# Altium schematic symbol library jlcpcb_2025_04_capacitors_extended_0201.schlib: 1175 symbols (part 2 of 7)
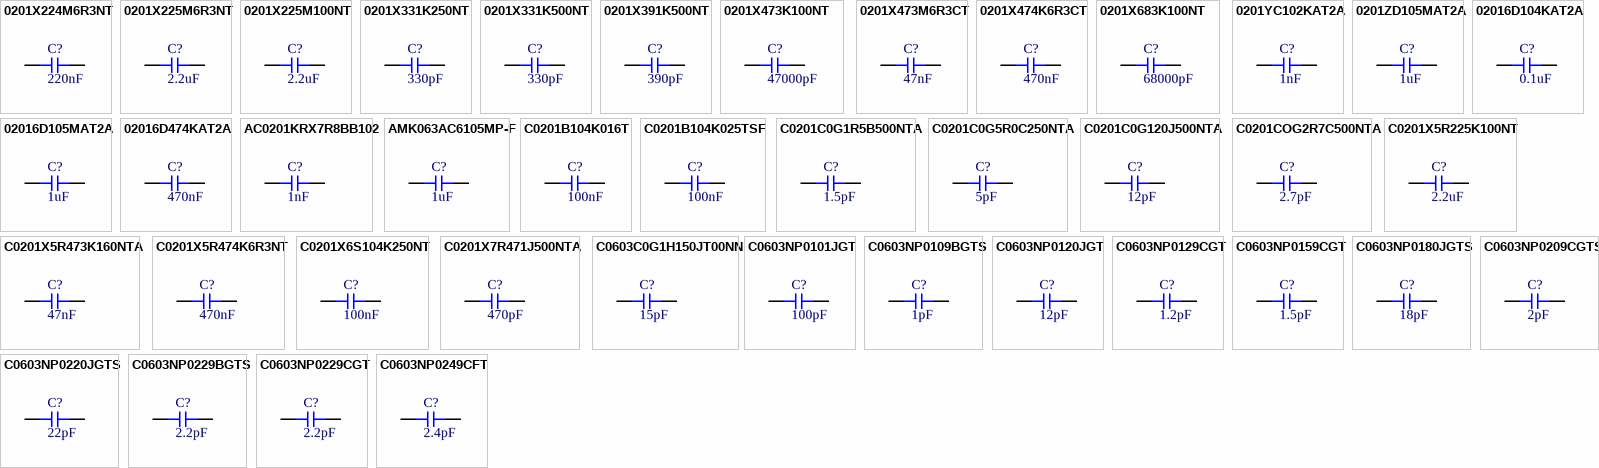
[diagram p30: symbols 0201X224M6R3NT to C0603NP0249CFT]

## C0201C0G5R0C250NTA
designator C?  Capacitance: 5pF  (hidden comment: *)
Capacitor, Ceramic (MLCC), 5pF, 25V, C0G, SMD 0201; Manufacturer: EYANG(Shenzhen Eyang Tech Development); Manufacturer Part Number: C0201C0G5R0C250NTA; Package Size: 0201; JLCPCB Basic Part: No; JLCPCB Part Number: C778329; Supplier 1: LCSC; Category: Capacitors - MLCC; Supplier Part Number 1: C778329; Voltage Rating: 25V; Temperature Coefficient: C0G; RoHS: Yes; ComponentLink1Description: Datasheet; ComponentLink1URL: https://datasheet.lcsc.com/lcsc/2011061108_EYANG-Shenzhen-Eyang-Tech-Development-C0201C0G5R0C250NTA_C778329.pdf; ComponentLink2Description: JLCPCB Part URL; ComponentLink2URL: https://jlcpcb.com/partdetail/C778329; ComponentLink3Description: LCSC Part URL; ComponentLink3URL: https://lcsc.com/product-detail/Multilayer-Ceramic-Capacitors-MLCC---SMD-SMT_EYANGShenzhen-Eyang-Tech-Development-EYANGShenzhen-Eyang-Tech-Development-C0201C0G5R0C250NTA_C778329.html
footprint CAP-0201 (0201 (0603M) Capacitor)
pins: 1, 2

## C0201C0G120J500NTA
designator C?  Capacitance: 12pF  (hidden comment: *)
Capacitor, Ceramic (MLCC), 12pF, ±5%, 50V, C0G, ±5%, SMD 0201; Manufacturer: EYANG(Shenzhen Eyang Tech Development); Manufacturer Part Number: C0201C0G120J500NTA; Package Size: 0201; JLCPCB Basic Part: No; JLCPCB Part Number: C115541; Supplier 1: LCSC; Category: Capacitors - MLCC; Supplier Part Number 1: C115541; Tolerance: ±5%; Voltage Rating: 50V; Temperature Coefficient: C0G; RoHS: Yes; ComponentLink1Description: Datasheet; ComponentLink1URL: https://datasheet.lcsc.com/lcsc/2304140030_EYANG-Shenzhen-Eyang-Tech-Development-C0201C0G120J500NTA_C115541.pdf; ComponentLink2Description: JLCPCB Part URL; ComponentLink2URL: https://jlcpcb.com/partdetail/C115541; ComponentLink3Description: LCSC Part URL; ComponentLink3URL: https://lcsc.com/product-detail/Multilayer-Ceramic-Capacitors-MLCC---SMD-SMT_EYANGShenzhen-Eyang-Tech-Development-EYANGShenzhen-Eyang-Tech-Development-C0201C0G120J500NTA_C115541.html
footprint CAP-0201 (0201 (0603M) Capacitor)
pins: 1, 2

## C0201COG2R7C500NTA
designator C?  Capacitance: 2.7pF  (hidden comment: *)
Capacitor, Ceramic (MLCC), 2.7pF, 50V, C0G, SMD 0201; Manufacturer: EYANG(Shenzhen Eyang Tech Development); Manufacturer Part Number: C0201COG2R7C500NTA; Package Size: 0201; JLCPCB Basic Part: No; JLCPCB Part Number: C183666; Supplier 1: LCSC; Category: Capacitors - MLCC; Supplier Part Number 1: C183666; Voltage Rating: 50V; Temperature Coefficient: C0G; RoHS: Yes; ComponentLink1Description: Datasheet; ComponentLink1URL: https://datasheet.lcsc.com/lcsc/2304140030_EYANG-Shenzhen-Eyang-Tech-Development-C0201COG2R7C500NTA_C183666.pdf; ComponentLink2Description: JLCPCB Part URL; ComponentLink2URL: https://jlcpcb.com/partdetail/C183666; ComponentLink3Description: LCSC Part URL; ComponentLink3URL: https://lcsc.com/product-detail/Multilayer-Ceramic-Capacitors-MLCC---SMD-SMT_EYANGShenzhen-Eyang-Tech-Development-EYANGShenzhen-Eyang-Tech-Development-C0201COG2R7C500NTA_C183666.html
footprint CAP-0201 (0201 (0603M) Capacitor)
pins: 1, 2

## C0201X5R225K100NT
designator C?  Capacitance: 2.2uF  (hidden comment: *)
Capacitor, Ceramic (MLCC), 2.2uF, ±10%, 10V, ±10%, SMD 0201; Manufacturer: SANYEAR; Manufacturer Part Number: C0201X5R225K100NT; Package Size: 0201; JLCPCB Basic Part: No; JLCPCB Part Number: C729446; Supplier 1: LCSC; Category: Capacitors - MLCC; Supplier Part Number 1: C729446; Tolerance: ±10%; Voltage Rating: 10V; RoHS: Yes; ComponentLink1Description: Datasheet; ComponentLink1URL: https://wmsc.lcsc.com/wmsc/upload/file/pdf/v2/lcsc/2304140030_SANYEAR-C0201X5R225K100NT_C729446.pdf; ComponentLink2Description: JLCPCB Part URL; ComponentLink2URL: https://jlcpcb.com/partdetail/C729446; ComponentLink3Description: LCSC Part URL; ComponentLink3URL: https://lcsc.com/product-detail/Multilayer-Ceramic-Capacitors-MLCC---SMD-SMT_SANYEAR-SANYEAR-C0201X5R225K100NT_C729446.html
footprint CAP-0201 (0201 (0603M) Capacitor)
pins: 1, 2

## C0201X5R473K160NTA
designator C?  Capacitance: 47nF  (hidden comment: *)
Capacitor, Ceramic (MLCC), 47nF, ±10%, 16V, X5R, ±10%, SMD 0201; Manufacturer: EYANG(Shenzhen Eyang Tech Development); Manufacturer Part Number: C0201X5R473K160NTA; Package Size: 0201; JLCPCB Basic Part: No; JLCPCB Part Number: C124806; Supplier 1: LCSC; Category: Capacitors - MLCC; Supplier Part Number 1: C124806; Tolerance: ±10%; Voltage Rating: 16V; Temperature Coefficient: X5R; RoHS: Yes; ComponentLink1Description: Datasheet; ComponentLink1URL: https://datasheet.lcsc.com/lcsc/2304140030_EYANG-Shenzhen-Eyang-Tech-Development-C0201X5R473K160NTA_C124806.pdf; ComponentLink2Description: JLCPCB Part URL; ComponentLink2URL: https://jlcpcb.com/partdetail/C124806; ComponentLink3Description: LCSC Part URL; ComponentLink3URL: https://lcsc.com/product-detail/Multilayer-Ceramic-Capacitors-MLCC---SMD-SMT_EYANGShenzhen-Eyang-Tech-Development-EYANGShenzhen-Eyang-Tech-Development-C0201X5R473K160NTA_C124806.html
footprint CAP-0201 (0201 (0603M) Capacitor)
pins: 1, 2

## C0201X5R474K6R3NT
designator C?  Capacitance: 470nF  (hidden comment: *)
Capacitor, Ceramic (MLCC), 470nF, ±10%, 6.3V, ±10%, SMD 0201; Manufacturer: SANYEAR; Manufacturer Part Number: C0201X5R474K6R3NT; Package Size: 0201; JLCPCB Basic Part: No; JLCPCB Part Number: C729447; Supplier 1: LCSC; Category: Capacitors - MLCC; Supplier Part Number 1: C729447; Tolerance: ±10%; Voltage Rating: 6.3V; RoHS: Yes; ComponentLink1Description: Datasheet; ComponentLink1URL: https://wmsc.lcsc.com/wmsc/upload/file/pdf/v2/lcsc/2304140030_SANYEAR-C0201X5R474K6R3NT_C729447.pdf; ComponentLink2Description: JLCPCB Part URL; ComponentLink2URL: https://jlcpcb.com/partdetail/C729447; ComponentLink3Description: LCSC Part URL; ComponentLink3URL: https://lcsc.com/product-detail/Multilayer-Ceramic-Capacitors-MLCC---SMD-SMT_SANYEAR-SANYEAR-C0201X5R474K6R3NT_C729447.html
footprint CAP-0201 (0201 (0603M) Capacitor)
pins: 1, 2

## C0201X6S104K250NT
designator C?  Capacitance: 100nF  (hidden comment: *)
Capacitor, Ceramic (MLCC), 100nF, ±10%, 25V, ±10%, SMD 0201; Manufacturer: SANYEAR; Manufacturer Part Number: C0201X6S104K250NT; Package Size: 0201; JLCPCB Basic Part: No; JLCPCB Part Number: C2844319; Supplier 1: LCSC; Category: Capacitors - MLCC; Supplier Part Number 1: C2844319; Tolerance: ±10%; Voltage Rating: 25V; RoHS: Yes; ComponentLink1Description: Datasheet; ComponentLink1URL: https://wmsc.lcsc.com/wmsc/upload/file/pdf/v2/lcsc/2304140030_SANYEAR-C0201X6S104K250NT_C2844319.pdf; ComponentLink2Description: JLCPCB Part URL; ComponentLink2URL: https://jlcpcb.com/partdetail/C2844319; ComponentLink3Description: LCSC Part URL; ComponentLink3URL: https://lcsc.com/product-detail/Multilayer-Ceramic-Capacitors-MLCC---SMD-SMT_SANYEAR-SANYEAR-C0201X6S104K250NT_C2844319.html
footprint CAP-0201 (0201 (0603M) Capacitor)
pins: 1, 2

## C0201X7R471J500NTA
designator C?  Capacitance: 470pF  (hidden comment: *)
Capacitor, Ceramic (MLCC), 470pF, ±5%, 50V, X7R, ±5%, SMD 0201; Manufacturer: EYANG(Shenzhen Eyang Tech Development); Manufacturer Part Number: C0201X7R471J500NTA; Package Size: 0201; JLCPCB Basic Part: No; JLCPCB Part Number: C881960; Supplier 1: LCSC; Category: Capacitors - MLCC; Supplier Part Number 1: C881960; Tolerance: ±5%; Voltage Rating: 50V; Temperature Coefficient: X7R; RoHS: Yes; ComponentLink1Description: Datasheet; ComponentLink1URL: https://datasheet.lcsc.com/lcsc/2011261608_EYANG-Shenzhen-Eyang-Tech-Development-C0201X7R471J500NTA_C881960.pdf; ComponentLink2Description: JLCPCB Part URL; ComponentLink2URL: https://jlcpcb.com/partdetail/C881960; ComponentLink3Description: LCSC Part URL; ComponentLink3URL: https://lcsc.com/product-detail/Multilayer-Ceramic-Capacitors-MLCC---SMD-SMT_EYANGShenzhen-Eyang-Tech-Development-EYANGShenzhen-Eyang-Tech-Development-C0201X7R471J500NTA_C881960.html
footprint CAP-0201 (0201 (0603M) Capacitor)
pins: 1, 2

## C0603C0G1H150JT00NN
designator C?  Capacitance: 15pF  (hidden comment: *)
Capacitor, Ceramic (MLCC), 15pF, ±5%, 50V, C0G, ±5%, SMD 0201; Manufacturer: TDK; Manufacturer Part Number: C0603C0G1H150JT00NN; Package Size: 0201; JLCPCB Basic Part: No; JLCPCB Part Number: C694261; Supplier 1: LCSC; Category: Capacitors - MLCC; Supplier Part Number 1: C694261; Tolerance: ±5%; Voltage Rating: 50V; Temperature Coefficient: C0G; RoHS: Yes; ComponentLink1Description: Datasheet; ComponentLink1URL: https://wmsc.lcsc.com/wmsc/upload/file/pdf/v2/lcsc/2304140030_TDK-C0603C0G1H150JT00NN_C694261.pdf; ComponentLink2Description: JLCPCB Part URL; ComponentLink2URL: https://jlcpcb.com/partdetail/C694261; ComponentLink3Description: LCSC Part URL; ComponentLink3URL: https://lcsc.com/product-detail/Multilayer-Ceramic-Capacitors-MLCC---SMD-SMT_TDK-TDK-C0603C0G1H150JT00NN_C694261.html
footprint CAP-0201 (0201 (0603M) Capacitor)
pins: 1, 2

## C0603NP0101JGT
designator C?  Capacitance: 100pF  (hidden comment: *)
Capacitor, Ceramic (MLCC), 100pF, ±5%, 50V, NP0, ±5%, SMD 0201; Manufacturer: Darfon Elec; Manufacturer Part Number: C0603NP0101JGT; Package Size: 0201; JLCPCB Basic Part: No; JLCPCB Part Number: C258474; Supplier 1: LCSC; Category: Capacitors - MLCC; Supplier Part Number 1: C258474; Tolerance: ±5%; Voltage Rating: 50V; Temperature Coefficient: NP0; RoHS: Yes; ComponentLink1Description: Datasheet; ComponentLink1URL: https://wmsc.lcsc.com/wmsc/upload/file/pdf/v2/lcsc/2304140030_Darfon-Elec-C0603NP0101JGT_C258474.pdf; ComponentLink2Description: JLCPCB Part URL; ComponentLink2URL: https://jlcpcb.com/partdetail/C258474; ComponentLink3Description: LCSC Part URL; ComponentLink3URL: https://lcsc.com/product-detail/Multilayer-Ceramic-Capacitors-MLCC---SMD-SMT_Darfon-Elec-Darfon-Elec-C0603NP0101JGT_C258474.html
footprint CAP-0201 (0201 (0603M) Capacitor)
pins: 1, 2

## C0603NP0109BGTS
designator C?  Capacitance: 1pF  (hidden comment: *)
Capacitor, Ceramic (MLCC), 1pF, 50V, NP0, SMD 0201; Manufacturer: Darfon Elec; Manufacturer Part Number: C0603NP0109BGTS; Package Size: 0201; JLCPCB Basic Part: No; JLCPCB Part Number: C312122; Supplier 1: LCSC; Category: Capacitors - MLCC; Supplier Part Number 1: C312122; Voltage Rating: 50V; Temperature Coefficient: NP0; RoHS: Yes; ComponentLink1Description: Datasheet; ComponentLink1URL: https://wmsc.lcsc.com/wmsc/upload/file/pdf/v2/lcsc/2304140030_Darfon-Elec-C0603NP0109BGTS_C312122.pdf; ComponentLink2Description: JLCPCB Part URL; ComponentLink2URL: https://jlcpcb.com/partdetail/C312122; ComponentLink3Description: LCSC Part URL; ComponentLink3URL: https://lcsc.com/product-detail/Multilayer-Ceramic-Capacitors-MLCC---SMD-SMT_Darfon-Elec-Darfon-Elec-C0603NP0109BGTS_C312122.html
footprint CAP-0201 (0201 (0603M) Capacitor)
pins: 1, 2

## C0603NP0120JGT
designator C?  Capacitance: 12pF  (hidden comment: *)
Capacitor, Ceramic (MLCC), 12pF, ±5%, 50V, NP0, ±5%, SMD 0201; Manufacturer: Darfon Elec; Manufacturer Part Number: C0603NP0120JGT; Package Size: 0201; JLCPCB Basic Part: No; JLCPCB Part Number: C258465; Supplier 1: LCSC; Category: Capacitors - MLCC; Supplier Part Number 1: C258465; Tolerance: ±5%; Voltage Rating: 50V; Temperature Coefficient: NP0; RoHS: Yes; ComponentLink1Description: Datasheet; ComponentLink1URL: https://wmsc.lcsc.com/wmsc/upload/file/pdf/v2/lcsc/2304140030_Darfon-Elec-C0603NP0120JGT_C258465.pdf; ComponentLink2Description: JLCPCB Part URL; ComponentLink2URL: https://jlcpcb.com/partdetail/C258465; ComponentLink3Description: LCSC Part URL; ComponentLink3URL: https://lcsc.com/product-detail/Multilayer-Ceramic-Capacitors-MLCC---SMD-SMT_Darfon-Elec-Darfon-Elec-C0603NP0120JGT_C258465.html
footprint CAP-0201 (0201 (0603M) Capacitor)
pins: 1, 2

## C0603NP0129CGT
designator C?  Capacitance: 1.2pF  (hidden comment: *)
Capacitor, Ceramic (MLCC), 1.2pF, 50V, NP0, SMD 0201; Manufacturer: Darfon Elec; Manufacturer Part Number: C0603NP0129CGT; Package Size: 0201; JLCPCB Basic Part: No; JLCPCB Part Number: C267348; Supplier 1: LCSC; Category: Capacitors - MLCC; Supplier Part Number 1: C267348; Voltage Rating: 50V; Temperature Coefficient: NP0; RoHS: Yes; ComponentLink1Description: Datasheet; ComponentLink1URL: https://wmsc.lcsc.com/wmsc/upload/file/pdf/v2/lcsc/2304140030_Darfon-Elec-C0603NP0129CGT_C267348.pdf; ComponentLink2Description: JLCPCB Part URL; ComponentLink2URL: https://jlcpcb.com/partdetail/C267348; ComponentLink3Description: LCSC Part URL; ComponentLink3URL: https://lcsc.com/product-detail/Multilayer-Ceramic-Capacitors-MLCC---SMD-SMT_Darfon-Elec-Darfon-Elec-C0603NP0129CGT_C267348.html
footprint CAP-0201 (0201 (0603M) Capacitor)
pins: 1, 2

## C0603NP0159CGT
designator C?  Capacitance: 1.5pF  (hidden comment: *)
Capacitor, Ceramic (MLCC), 1.5pF, 50V, NP0, SMD 0201; Manufacturer: Darfon Elec; Manufacturer Part Number: C0603NP0159CGT; Package Size: 0201; JLCPCB Basic Part: No; JLCPCB Part Number: C258458; Supplier 1: LCSC; Category: Capacitors - MLCC; Supplier Part Number 1: C258458; Voltage Rating: 50V; Temperature Coefficient: NP0; RoHS: Yes; ComponentLink1Description: Datasheet; ComponentLink1URL: https://wmsc.lcsc.com/wmsc/upload/file/pdf/v2/lcsc/2304140030_Darfon-Elec-C0603NP0159CGT_C258458.pdf; ComponentLink2Description: JLCPCB Part URL; ComponentLink2URL: https://jlcpcb.com/partdetail/C258458; ComponentLink3Description: LCSC Part URL; ComponentLink3URL: https://lcsc.com/product-detail/Multilayer-Ceramic-Capacitors-MLCC---SMD-SMT_Darfon-Elec-Darfon-Elec-C0603NP0159CGT_C258458.html
footprint CAP-0201 (0201 (0603M) Capacitor)
pins: 1, 2

## C0603NP0180JGTS
designator C?  Capacitance: 18pF  (hidden comment: *)
Capacitor, Ceramic (MLCC), 18pF, ±5%, 50V, NP0, ±5%, SMD 0201; Manufacturer: Darfon Elec; Manufacturer Part Number: C0603NP0180JGTS; Package Size: 0201; JLCPCB Basic Part: No; JLCPCB Part Number: C312097; Supplier 1: LCSC; Category: Capacitors - MLCC; Supplier Part Number 1: C312097; Tolerance: ±5%; Voltage Rating: 50V; Temperature Coefficient: NP0; RoHS: Yes; ComponentLink1Description: Datasheet; ComponentLink1URL: https://wmsc.lcsc.com/wmsc/upload/file/pdf/v2/lcsc/2304140030_Darfon-Elec-C0603NP0180JGTS_C312097.pdf; ComponentLink2Description: JLCPCB Part URL; ComponentLink2URL: https://jlcpcb.com/partdetail/C312097; ComponentLink3Description: LCSC Part URL; ComponentLink3URL: https://lcsc.com/product-detail/Multilayer-Ceramic-Capacitors-MLCC---SMD-SMT_Darfon-Elec-Darfon-Elec-C0603NP0180JGTS_C312097.html
footprint CAP-0201 (0201 (0603M) Capacitor)
pins: 1, 2

## C0603NP0209CGTS
designator C?  Capacitance: 2pF  (hidden comment: *)
Capacitor, Ceramic (MLCC), 2pF, 50V, NP0, SMD 0201; Manufacturer: Darfon Elec; Manufacturer Part Number: C0603NP0209CGTS; Package Size: 0201; JLCPCB Basic Part: No; JLCPCB Part Number: C312083; Supplier 1: LCSC; Category: Capacitors - MLCC; Supplier Part Number 1: C312083; Voltage Rating: 50V; Temperature Coefficient: NP0; RoHS: Yes; ComponentLink1Description: Datasheet; ComponentLink1URL: https://wmsc.lcsc.com/wmsc/upload/file/pdf/v2/lcsc/2304140030_Darfon-Elec-C0603NP0209CGTS_C312083.pdf; ComponentLink2Description: JLCPCB Part URL; ComponentLink2URL: https://jlcpcb.com/partdetail/C312083; ComponentLink3Description: LCSC Part URL; ComponentLink3URL: https://lcsc.com/product-detail/Multilayer-Ceramic-Capacitors-MLCC---SMD-SMT_Darfon-Elec-Darfon-Elec-C0603NP0209CGTS_C312083.html
footprint CAP-0201 (0201 (0603M) Capacitor)
pins: 1, 2

## C0603NP0220JGTS
designator C?  Capacitance: 22pF  (hidden comment: *)
Capacitor, Ceramic (MLCC), 22pF, ±5%, 50V, NP0, ±5%, SMD 0201; Manufacturer: Darfon Elec; Manufacturer Part Number: C0603NP0220JGTS; Package Size: 0201; JLCPCB Basic Part: No; JLCPCB Part Number: C258468; Supplier 1: LCSC; Category: Capacitors - MLCC; Supplier Part Number 1: C258468; Tolerance: ±5%; Voltage Rating: 50V; Temperature Coefficient: NP0; RoHS: Yes; ComponentLink1Description: Datasheet; ComponentLink1URL: https://wmsc.lcsc.com/wmsc/upload/file/pdf/v2/lcsc/2304140030_Darfon-Elec-C0603NP0220JGTS_C258468.pdf; ComponentLink2Description: JLCPCB Part URL; ComponentLink2URL: https://jlcpcb.com/partdetail/C258468; ComponentLink3Description: LCSC Part URL; ComponentLink3URL: https://lcsc.com/product-detail/Multilayer-Ceramic-Capacitors-MLCC---SMD-SMT_Darfon-Elec-Darfon-Elec-C0603NP0220JGTS_C258468.html
footprint CAP-0201 (0201 (0603M) Capacitor)
pins: 1, 2

## C0603NP0229BGTS
designator C?  Capacitance: 2.2pF  (hidden comment: *)
Capacitor, Ceramic (MLCC), 2.2pF, 50V, NP0, SMD 0201; Manufacturer: Darfon Elec; Manufacturer Part Number: C0603NP0229BGTS; Package Size: 0201; JLCPCB Basic Part: No; JLCPCB Part Number: C312076; Supplier 1: LCSC; Category: Capacitors - MLCC; Supplier Part Number 1: C312076; Voltage Rating: 50V; Temperature Coefficient: NP0; RoHS: Yes; ComponentLink1Description: Datasheet; ComponentLink1URL: https://wmsc.lcsc.com/wmsc/upload/file/pdf/v2/lcsc/2304140030_Darfon-Elec-C0603NP0229BGTS_C312076.pdf; ComponentLink2Description: JLCPCB Part URL; ComponentLink2URL: https://jlcpcb.com/partdetail/C312076; ComponentLink3Description: LCSC Part URL; ComponentLink3URL: https://lcsc.com/product-detail/Multilayer-Ceramic-Capacitors-MLCC---SMD-SMT_Darfon-Elec-Darfon-Elec-C0603NP0229BGTS_C312076.html
footprint CAP-0201 (0201 (0603M) Capacitor)
pins: 1, 2

## C0603NP0229CGT
designator C?  Capacitance: 2.2pF  (hidden comment: *)
Capacitor, Ceramic (MLCC), 2.2pF, 50V, NP0, SMD 0201; Manufacturer: Darfon Elec; Manufacturer Part Number: C0603NP0229CGT; Package Size: 0201; JLCPCB Basic Part: No; JLCPCB Part Number: C267353; Supplier 1: LCSC; Category: Capacitors - MLCC; Supplier Part Number 1: C267353; Voltage Rating: 50V; Temperature Coefficient: NP0; RoHS: Yes; ComponentLink1Description: Datasheet; ComponentLink1URL: https://wmsc.lcsc.com/wmsc/upload/file/pdf/v2/lcsc/2304140030_Darfon-Elec-C0603NP0229CGT_C267353.pdf; ComponentLink2Description: JLCPCB Part URL; ComponentLink2URL: https://jlcpcb.com/partdetail/C267353; ComponentLink3Description: LCSC Part URL; ComponentLink3URL: https://lcsc.com/product-detail/Multilayer-Ceramic-Capacitors-MLCC---SMD-SMT_Darfon-Elec-Darfon-Elec-C0603NP0229CGT_C267353.html
footprint CAP-0201 (0201 (0603M) Capacitor)
pins: 1, 2

## C0603NP0249CFT
designator C?  Capacitance: 2.4pF  (hidden comment: *)
Capacitor, Ceramic (MLCC), 2.4pF, 25V, NP0, SMD 0201; Manufacturer: Darfon Elec; Manufacturer Part Number: C0603NP0249CFT; Package Size: 0201; JLCPCB Basic Part: No; JLCPCB Part Number: C267354; Supplier 1: LCSC; Category: Capacitors - MLCC; Supplier Part Number 1: C267354; Voltage Rating: 25V; Temperature Coefficient: NP0; RoHS: Yes; ComponentLink1Description: Datasheet; ComponentLink1URL: https://wmsc.lcsc.com/wmsc/upload/file/pdf/v2/lcsc/2304140030_Darfon-Elec-C0603NP0249CFT_C267354.pdf; ComponentLink2Description: JLCPCB Part URL; ComponentLink2URL: https://jlcpcb.com/partdetail/C267354; ComponentLink3Description: LCSC Part URL; ComponentLink3URL: https://lcsc.com/product-detail/Multilayer-Ceramic-Capacitors-MLCC---SMD-SMT_Darfon-Elec-Darfon-Elec-C0603NP0249CFT_C267354.html
footprint CAP-0201 (0201 (0603M) Capacitor)
pins: 1, 2

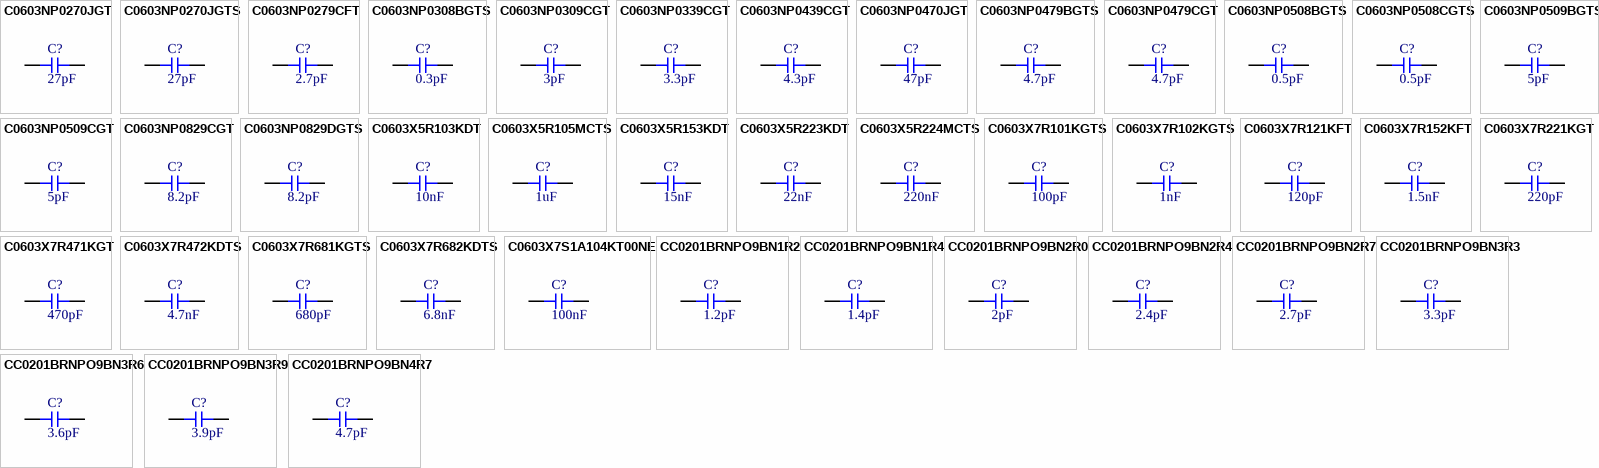
[diagram p5: symbols C0603NP0270JGT to CC0201BRNPO9BN4R7]

## C0603NP0270JGT
designator C?  Capacitance: 27pF  (hidden comment: *)
Capacitor, Ceramic (MLCC), 27pF, ±5%, 50V, NP0, ±5%, SMD 0201; Manufacturer: Darfon Elec; Manufacturer Part Number: C0603NP0270JGT; Package Size: 0201; JLCPCB Basic Part: No; JLCPCB Part Number: C258469; Supplier 1: LCSC; Category: Capacitors - MLCC; Supplier Part Number 1: C258469; Tolerance: ±5%; Voltage Rating: 50V; Temperature Coefficient: NP0; RoHS: Yes; ComponentLink1Description: Datasheet; ComponentLink1URL: https://wmsc.lcsc.com/wmsc/upload/file/pdf/v2/lcsc/2304140030_Darfon-Elec-C0603NP0270JGT_C258469.pdf; ComponentLink2Description: JLCPCB Part URL; ComponentLink2URL: https://jlcpcb.com/partdetail/C258469; ComponentLink3Description: LCSC Part URL; ComponentLink3URL: https://lcsc.com/product-detail/Multilayer-Ceramic-Capacitors-MLCC---SMD-SMT_Darfon-Elec-Darfon-Elec-C0603NP0270JGT_C258469.html
footprint CAP-0201 (0201 (0603M) Capacitor)
pins: 1, 2

## C0603NP0270JGTS
designator C?  Capacitance: 27pF  (hidden comment: *)
Capacitor, Ceramic (MLCC), 27pF, ±5%, 50V, NP0, ±5%, SMD 0201; Manufacturer: Darfon Elec; Manufacturer Part Number: C0603NP0270JGTS; Package Size: 0201; JLCPCB Basic Part: No; JLCPCB Part Number: C312072; Supplier 1: LCSC; Category: Capacitors - MLCC; Supplier Part Number 1: C312072; Tolerance: ±5%; Voltage Rating: 50V; Temperature Coefficient: NP0; RoHS: Yes; ComponentLink1Description: Datasheet; ComponentLink1URL: https://wmsc.lcsc.com/wmsc/upload/file/pdf/v2/lcsc/2304140030_Darfon-Elec-C0603NP0270JGTS_C312072.pdf; ComponentLink2Description: JLCPCB Part URL; ComponentLink2URL: https://jlcpcb.com/partdetail/C312072; ComponentLink3Description: LCSC Part URL; ComponentLink3URL: https://lcsc.com/product-detail/Multilayer-Ceramic-Capacitors-MLCC---SMD-SMT_Darfon-Elec-Darfon-Elec-C0603NP0270JGTS_C312072.html
footprint CAP-0201 (0201 (0603M) Capacitor)
pins: 1, 2

## C0603NP0279CFT
designator C?  Capacitance: 2.7pF  (hidden comment: *)
Capacitor, Ceramic (MLCC), 2.7pF, 25V, NP0, SMD 0201; Manufacturer: Darfon Elec; Manufacturer Part Number: C0603NP0279CFT; Package Size: 0201; JLCPCB Basic Part: No; JLCPCB Part Number: C267355; Supplier 1: LCSC; Category: Capacitors - MLCC; Supplier Part Number 1: C267355; Voltage Rating: 25V; Temperature Coefficient: NP0; RoHS: Yes; ComponentLink1Description: Datasheet; ComponentLink1URL: https://wmsc.lcsc.com/wmsc/upload/file/pdf/v2/lcsc/2304140030_Darfon-Elec-C0603NP0279CFT_C267355.pdf; ComponentLink2Description: JLCPCB Part URL; ComponentLink2URL: https://jlcpcb.com/partdetail/C267355; ComponentLink3Description: LCSC Part URL; ComponentLink3URL: https://lcsc.com/product-detail/Multilayer-Ceramic-Capacitors-MLCC---SMD-SMT_Darfon-Elec-Darfon-Elec-C0603NP0279CFT_C267355.html
footprint CAP-0201 (0201 (0603M) Capacitor)
pins: 1, 2

## C0603NP0308BGTS
designator C?  Capacitance: 0.3pF  (hidden comment: *)
Capacitor, Ceramic (MLCC), 0.3pF, 50V, NP0, SMD 0201; Manufacturer: Darfon Elec; Manufacturer Part Number: C0603NP0308BGTS; Package Size: 0201; JLCPCB Basic Part: No; JLCPCB Part Number: C312062; Supplier 1: LCSC; Category: Capacitors - MLCC; Supplier Part Number 1: C312062; Voltage Rating: 50V; Temperature Coefficient: NP0; RoHS: Yes; ComponentLink1Description: Datasheet; ComponentLink1URL: https://wmsc.lcsc.com/wmsc/upload/file/pdf/v2/lcsc/2304140030_Darfon-Elec-C0603NP0308BGTS_C312062.pdf; ComponentLink2Description: JLCPCB Part URL; ComponentLink2URL: https://jlcpcb.com/partdetail/C312062; ComponentLink3Description: LCSC Part URL; ComponentLink3URL: https://lcsc.com/product-detail/Multilayer-Ceramic-Capacitors-MLCC---SMD-SMT_Darfon-Elec-Darfon-Elec-C0603NP0308BGTS_C312062.html
footprint CAP-0201 (0201 (0603M) Capacitor)
pins: 1, 2

## C0603NP0309CGT
designator C?  Capacitance: 3pF  (hidden comment: *)
Capacitor, Ceramic (MLCC), 3pF, 50V, NP0, SMD 0201; Manufacturer: Darfon Elec; Manufacturer Part Number: C0603NP0309CGT; Package Size: 0201; JLCPCB Basic Part: No; JLCPCB Part Number: C267356; Supplier 1: LCSC; Category: Capacitors - MLCC; Supplier Part Number 1: C267356; Voltage Rating: 50V; Temperature Coefficient: NP0; RoHS: Yes; ComponentLink1Description: Datasheet; ComponentLink1URL: https://wmsc.lcsc.com/wmsc/upload/file/pdf/v2/lcsc/2304140030_Darfon-Elec-C0603NP0309CGT_C267356.pdf; ComponentLink2Description: JLCPCB Part URL; ComponentLink2URL: https://jlcpcb.com/partdetail/C267356; ComponentLink3Description: LCSC Part URL; ComponentLink3URL: https://lcsc.com/product-detail/Multilayer-Ceramic-Capacitors-MLCC---SMD-SMT_Darfon-Elec-Darfon-Elec-C0603NP0309CGT_C267356.html
footprint CAP-0201 (0201 (0603M) Capacitor)
pins: 1, 2

## C0603NP0339CGT
designator C?  Capacitance: 3.3pF  (hidden comment: *)
Capacitor, Ceramic (MLCC), 3.3pF, 50V, NP0, SMD 0201; Manufacturer: Darfon Elec; Manufacturer Part Number: C0603NP0339CGT; Package Size: 0201; JLCPCB Basic Part: No; JLCPCB Part Number: C258460; Supplier 1: LCSC; Category: Capacitors - MLCC; Supplier Part Number 1: C258460; Voltage Rating: 50V; Temperature Coefficient: NP0; RoHS: Yes; ComponentLink1Description: Datasheet; ComponentLink1URL: https://wmsc.lcsc.com/wmsc/upload/file/pdf/v2/lcsc/2304140030_Darfon-Elec-C0603NP0339CGT_C258460.pdf; ComponentLink2Description: JLCPCB Part URL; ComponentLink2URL: https://jlcpcb.com/partdetail/C258460; ComponentLink3Description: LCSC Part URL; ComponentLink3URL: https://lcsc.com/product-detail/Multilayer-Ceramic-Capacitors-MLCC---SMD-SMT_Darfon-Elec-Darfon-Elec-C0603NP0339CGT_C258460.html
footprint CAP-0201 (0201 (0603M) Capacitor)
pins: 1, 2

## C0603NP0439CGT
designator C?  Capacitance: 4.3pF  (hidden comment: *)
Capacitor, Ceramic (MLCC), 4.3pF, 50V, NP0, SMD 0201; Manufacturer: Darfon Elec; Manufacturer Part Number: C0603NP0439CGT; Package Size: 0201; JLCPCB Basic Part: No; JLCPCB Part Number: C258462; Supplier 1: LCSC; Category: Capacitors - MLCC; Supplier Part Number 1: C258462; Voltage Rating: 50V; Temperature Coefficient: NP0; RoHS: Yes; ComponentLink1Description: Datasheet; ComponentLink1URL: https://wmsc.lcsc.com/wmsc/upload/file/pdf/v2/lcsc/2304140030_Darfon-Elec-C0603NP0439CGT_C258462.pdf; ComponentLink2Description: JLCPCB Part URL; ComponentLink2URL: https://jlcpcb.com/partdetail/C258462; ComponentLink3Description: LCSC Part URL; ComponentLink3URL: https://lcsc.com/product-detail/Multilayer-Ceramic-Capacitors-MLCC---SMD-SMT_Darfon-Elec-Darfon-Elec-C0603NP0439CGT_C258462.html
footprint CAP-0201 (0201 (0603M) Capacitor)
pins: 1, 2

## C0603NP0470JGT
designator C?  Capacitance: 47pF  (hidden comment: *)
Capacitor, Ceramic (MLCC), 47pF, ±5%, 50V, NP0, ±5%, SMD 0201; Manufacturer: Darfon Elec; Manufacturer Part Number: C0603NP0470JGT; Package Size: 0201; JLCPCB Basic Part: No; JLCPCB Part Number: C258472; Supplier 1: LCSC; Category: Capacitors - MLCC; Supplier Part Number 1: C258472; Tolerance: ±5%; Voltage Rating: 50V; Temperature Coefficient: NP0; RoHS: Yes; ComponentLink1Description: Datasheet; ComponentLink1URL: https://wmsc.lcsc.com/wmsc/upload/file/pdf/v2/lcsc/2304140030_Darfon-Elec-C0603NP0470JGT_C258472.pdf; ComponentLink2Description: JLCPCB Part URL; ComponentLink2URL: https://jlcpcb.com/partdetail/C258472; ComponentLink3Description: LCSC Part URL; ComponentLink3URL: https://lcsc.com/product-detail/Multilayer-Ceramic-Capacitors-MLCC---SMD-SMT_Darfon-Elec-Darfon-Elec-C0603NP0470JGT_C258472.html
footprint CAP-0201 (0201 (0603M) Capacitor)
pins: 1, 2

## C0603NP0479BGTS
designator C?  Capacitance: 4.7pF  (hidden comment: *)
Capacitor, Ceramic (MLCC), 4.7pF, 50V, NP0, SMD 0201; Manufacturer: Darfon Elec; Manufacturer Part Number: C0603NP0479BGTS; Package Size: 0201; JLCPCB Basic Part: No; JLCPCB Part Number: C311884; Supplier 1: LCSC; Category: Capacitors - MLCC; Supplier Part Number 1: C311884; Voltage Rating: 50V; Temperature Coefficient: NP0; RoHS: Yes; ComponentLink1Description: Datasheet; ComponentLink1URL: https://wmsc.lcsc.com/wmsc/upload/file/pdf/v2/lcsc/2304140030_Darfon-Elec-C0603NP0479BGTS_C311884.pdf; ComponentLink2Description: JLCPCB Part URL; ComponentLink2URL: https://jlcpcb.com/partdetail/C311884; ComponentLink3Description: LCSC Part URL; ComponentLink3URL: https://lcsc.com/product-detail/Multilayer-Ceramic-Capacitors-MLCC---SMD-SMT_Darfon-Elec-Darfon-Elec-C0603NP0479BGTS_C311884.html
footprint CAP-0201 (0201 (0603M) Capacitor)
pins: 1, 2

## C0603NP0479CGT
designator C?  Capacitance: 4.7pF  (hidden comment: *)
Capacitor, Ceramic (MLCC), 4.7pF, 50V, NP0, SMD 0201; Manufacturer: Darfon Elec; Manufacturer Part Number: C0603NP0479CGT; Package Size: 0201; JLCPCB Basic Part: No; JLCPCB Part Number: C258463; Supplier 1: LCSC; Category: Capacitors - MLCC; Supplier Part Number 1: C258463; Voltage Rating: 50V; Temperature Coefficient: NP0; RoHS: Yes; ComponentLink1Description: Datasheet; ComponentLink1URL: https://wmsc.lcsc.com/wmsc/upload/file/pdf/v2/lcsc/2304140030_Darfon-Elec-C0603NP0479CGT_C258463.pdf; ComponentLink2Description: JLCPCB Part URL; ComponentLink2URL: https://jlcpcb.com/partdetail/C258463; ComponentLink3Description: LCSC Part URL; ComponentLink3URL: https://lcsc.com/product-detail/Multilayer-Ceramic-Capacitors-MLCC---SMD-SMT_Darfon-Elec-Darfon-Elec-C0603NP0479CGT_C258463.html
footprint CAP-0201 (0201 (0603M) Capacitor)
pins: 1, 2

## C0603NP0508BGTS
designator C?  Capacitance: 0.5pF  (hidden comment: *)
Capacitor, Ceramic (MLCC), 0.5pF, 50V, NP0, SMD 0201; Manufacturer: Darfon Elec; Manufacturer Part Number: C0603NP0508BGTS; Package Size: 0201; JLCPCB Basic Part: No; JLCPCB Part Number: C311882; Supplier 1: LCSC; Category: Capacitors - MLCC; Supplier Part Number 1: C311882; Voltage Rating: 50V; Temperature Coefficient: NP0; RoHS: Yes; ComponentLink1Description: Datasheet; ComponentLink1URL: https://wmsc.lcsc.com/wmsc/upload/file/pdf/v2/lcsc/2304140030_Darfon-Elec-C0603NP0508BGTS_C311882.pdf; ComponentLink2Description: JLCPCB Part URL; ComponentLink2URL: https://jlcpcb.com/partdetail/C311882; ComponentLink3Description: LCSC Part URL; ComponentLink3URL: https://lcsc.com/product-detail/Multilayer-Ceramic-Capacitors-MLCC---SMD-SMT_Darfon-Elec-Darfon-Elec-C0603NP0508BGTS_C311882.html
footprint CAP-0201 (0201 (0603M) Capacitor)
pins: 1, 2

## C0603NP0508CGTS
designator C?  Capacitance: 0.5pF  (hidden comment: *)
Capacitor, Ceramic (MLCC), 0.5pF, 50V, NP0, SMD 0201; Manufacturer: Darfon Elec; Manufacturer Part Number: C0603NP0508CGTS; Package Size: 0201; JLCPCB Basic Part: No; JLCPCB Part Number: C311881; Supplier 1: LCSC; Category: Capacitors - MLCC; Supplier Part Number 1: C311881; Voltage Rating: 50V; Temperature Coefficient: NP0; RoHS: Yes; ComponentLink1Description: Datasheet; ComponentLink1URL: https://wmsc.lcsc.com/wmsc/upload/file/pdf/v2/lcsc/2304140030_Darfon-Elec-C0603NP0508CGTS_C311881.pdf; ComponentLink2Description: JLCPCB Part URL; ComponentLink2URL: https://jlcpcb.com/partdetail/C311881; ComponentLink3Description: LCSC Part URL; ComponentLink3URL: https://lcsc.com/product-detail/Multilayer-Ceramic-Capacitors-MLCC---SMD-SMT_Darfon-Elec-Darfon-Elec-C0603NP0508CGTS_C311881.html
footprint CAP-0201 (0201 (0603M) Capacitor)
pins: 1, 2

## C0603NP0509BGTS
designator C?  Capacitance: 5pF  (hidden comment: *)
Capacitor, Ceramic (MLCC), 5pF, 50V, NP0, SMD 0201; Manufacturer: Darfon Elec; Manufacturer Part Number: C0603NP0509BGTS; Package Size: 0201; JLCPCB Basic Part: No; JLCPCB Part Number: C311879; Supplier 1: LCSC; Category: Capacitors - MLCC; Supplier Part Number 1: C311879; Voltage Rating: 50V; Temperature Coefficient: NP0; RoHS: Yes; ComponentLink1Description: Datasheet; ComponentLink1URL: https://wmsc.lcsc.com/wmsc/upload/file/pdf/v2/lcsc/2304140030_Darfon-Elec-C0603NP0509BGTS_C311879.pdf; ComponentLink2Description: JLCPCB Part URL; ComponentLink2URL: https://jlcpcb.com/partdetail/C311879; ComponentLink3Description: LCSC Part URL; ComponentLink3URL: https://lcsc.com/product-detail/Multilayer-Ceramic-Capacitors-MLCC---SMD-SMT_Darfon-Elec-Darfon-Elec-C0603NP0509BGTS_C311879.html
footprint CAP-0201 (0201 (0603M) Capacitor)
pins: 1, 2

## C0603NP0509CGT
designator C?  Capacitance: 5pF  (hidden comment: *)
Capacitor, Ceramic (MLCC), 5pF, 50V, NP0, SMD 0201; Manufacturer: Darfon Elec; Manufacturer Part Number: C0603NP0509CGT; Package Size: 0201; JLCPCB Basic Part: No; JLCPCB Part Number: C267363; Supplier 1: LCSC; Category: Capacitors - MLCC; Supplier Part Number 1: C267363; Voltage Rating: 50V; Temperature Coefficient: NP0; RoHS: Yes; ComponentLink1Description: Datasheet; ComponentLink1URL: https://wmsc.lcsc.com/wmsc/upload/file/pdf/v2/lcsc/2304140030_Darfon-Elec-C0603NP0509CGT_C267363.pdf; ComponentLink2Description: JLCPCB Part URL; ComponentLink2URL: https://jlcpcb.com/partdetail/C267363; ComponentLink3Description: LCSC Part URL; ComponentLink3URL: https://lcsc.com/product-detail/Multilayer-Ceramic-Capacitors-MLCC---SMD-SMT_Darfon-Elec-Darfon-Elec-C0603NP0509CGT_C267363.html
footprint CAP-0201 (0201 (0603M) Capacitor)
pins: 1, 2

## C0603NP0829CGT
designator C?  Capacitance: 8.2pF  (hidden comment: *)
Capacitor, Ceramic (MLCC), 8.2pF, 50V, NP0, SMD 0201; Manufacturer: Darfon Elec; Manufacturer Part Number: C0603NP0829CGT; Package Size: 0201; JLCPCB Basic Part: No; JLCPCB Part Number: C267370; Supplier 1: LCSC; Category: Capacitors - MLCC; Supplier Part Number 1: C267370; Voltage Rating: 50V; Temperature Coefficient: NP0; RoHS: Yes; ComponentLink1Description: Datasheet; ComponentLink1URL: https://wmsc.lcsc.com/wmsc/upload/file/pdf/v2/lcsc/2304140030_Darfon-Elec-C0603NP0829CGT_C267370.pdf; ComponentLink2Description: JLCPCB Part URL; ComponentLink2URL: https://jlcpcb.com/partdetail/C267370; ComponentLink3Description: LCSC Part URL; ComponentLink3URL: https://lcsc.com/product-detail/Multilayer-Ceramic-Capacitors-MLCC---SMD-SMT_Darfon-Elec-Darfon-Elec-C0603NP0829CGT_C267370.html
footprint CAP-0201 (0201 (0603M) Capacitor)
pins: 1, 2

## C0603NP0829DGTS
designator C?  Capacitance: 8.2pF  (hidden comment: *)
Capacitor, Ceramic (MLCC), 8.2pF, 50V, NP0, SMD 0201; Manufacturer: Darfon Elec; Manufacturer Part Number: C0603NP0829DGTS; Package Size: 0201; JLCPCB Basic Part: No; JLCPCB Part Number: C311845; Supplier 1: LCSC; Category: Capacitors - MLCC; Supplier Part Number 1: C311845; Voltage Rating: 50V; Temperature Coefficient: NP0; RoHS: Yes; ComponentLink1Description: Datasheet; ComponentLink1URL: https://wmsc.lcsc.com/wmsc/upload/file/pdf/v2/lcsc/2304140030_Darfon-Elec-C0603NP0829DGTS_C311845.pdf; ComponentLink2Description: JLCPCB Part URL; ComponentLink2URL: https://jlcpcb.com/partdetail/C311845; ComponentLink3Description: LCSC Part URL; ComponentLink3URL: https://lcsc.com/product-detail/Multilayer-Ceramic-Capacitors-MLCC---SMD-SMT_Darfon-Elec-Darfon-Elec-C0603NP0829DGTS_C311845.html
footprint CAP-0201 (0201 (0603M) Capacitor)
pins: 1, 2

## C0603X5R103KDT
designator C?  Capacitance: 10nF  (hidden comment: *)
Capacitor, Ceramic (MLCC), 10nF, ±10%, 10V, X5R, ±10%, SMD 0201; Manufacturer: Darfon Elec; Manufacturer Part Number: C0603X5R103KDT; Package Size: 0201; JLCPCB Basic Part: No; JLCPCB Part Number: C258479; Supplier 1: LCSC; Category: Capacitors - MLCC; Supplier Part Number 1: C258479; Tolerance: ±10%; Voltage Rating: 10V; Temperature Coefficient: X5R; RoHS: Yes; ComponentLink1Description: Datasheet; ComponentLink1URL: https://wmsc.lcsc.com/wmsc/upload/file/pdf/v2/lcsc/2304140030_Darfon-Elec-C0603X5R103KDT_C258479.pdf; ComponentLink2Description: JLCPCB Part URL; ComponentLink2URL: https://jlcpcb.com/partdetail/C258479; ComponentLink3Description: LCSC Part URL; ComponentLink3URL: https://lcsc.com/product-detail/Multilayer-Ceramic-Capacitors-MLCC---SMD-SMT_Darfon-Elec-Darfon-Elec-C0603X5R103KDT_C258479.html
footprint CAP-0201 (0201 (0603M) Capacitor)
pins: 1, 2

## C0603X5R105MCTS
designator C?  Capacitance: 1uF  (hidden comment: *)
Capacitor, Ceramic (MLCC), 1uF, ±20%, 6.3V, X5R, ±20%, SMD 0201; Manufacturer: Darfon Elec; Manufacturer Part Number: C0603X5R105MCTS; Package Size: 0201; JLCPCB Basic Part: No; JLCPCB Part Number: C267439; Supplier 1: LCSC; Category: Capacitors - MLCC; Supplier Part Number 1: C267439; Tolerance: ±20%; Voltage Rating: 6.3V; Temperature Coefficient: X5R; RoHS: Yes; ComponentLink1Description: Datasheet; ComponentLink1URL: https://wmsc.lcsc.com/wmsc/upload/file/pdf/v2/lcsc/2304140030_Darfon-Elec-C0603X5R105MCTS_C267439.pdf; ComponentLink2Description: JLCPCB Part URL; ComponentLink2URL: https://jlcpcb.com/partdetail/C267439; ComponentLink3Description: LCSC Part URL; ComponentLink3URL: https://lcsc.com/product-detail/Multilayer-Ceramic-Capacitors-MLCC---SMD-SMT_Darfon-Elec-Darfon-Elec-C0603X5R105MCTS_C267439.html
footprint CAP-0201 (0201 (0603M) Capacitor)
pins: 1, 2

## C0603X5R153KDT
designator C?  Capacitance: 15nF  (hidden comment: *)
Capacitor, Ceramic (MLCC), 15nF, ±10%, 10V, X5R, ±10%, SMD 0201; Manufacturer: Darfon Elec; Manufacturer Part Number: C0603X5R153KDT; Package Size: 0201; JLCPCB Basic Part: No; JLCPCB Part Number: C258480; Supplier 1: LCSC; Category: Capacitors - MLCC; Supplier Part Number 1: C258480; Tolerance: ±10%; Voltage Rating: 10V; Temperature Coefficient: X5R; RoHS: Yes; ComponentLink1Description: Datasheet; ComponentLink1URL: https://wmsc.lcsc.com/wmsc/upload/file/pdf/v2/lcsc/2304140030_Darfon-Elec-C0603X5R153KDT_C258480.pdf; ComponentLink2Description: JLCPCB Part URL; ComponentLink2URL: https://jlcpcb.com/partdetail/C258480; ComponentLink3Description: LCSC Part URL; ComponentLink3URL: https://lcsc.com/product-detail/Multilayer-Ceramic-Capacitors-MLCC---SMD-SMT_Darfon-Elec-Darfon-Elec-C0603X5R153KDT_C258480.html
footprint CAP-0201 (0201 (0603M) Capacitor)
pins: 1, 2

## C0603X5R223KDT
designator C?  Capacitance: 22nF  (hidden comment: *)
Capacitor, Ceramic (MLCC), 22nF, ±10%, 10V, X5R, ±10%, SMD 0201; Manufacturer: Darfon Elec; Manufacturer Part Number: C0603X5R223KDT; Package Size: 0201; JLCPCB Basic Part: No; JLCPCB Part Number: C258481; Supplier 1: LCSC; Category: Capacitors - MLCC; Supplier Part Number 1: C258481; Tolerance: ±10%; Voltage Rating: 10V; Temperature Coefficient: X5R; RoHS: Yes; ComponentLink1Description: Datasheet; ComponentLink1URL: https://wmsc.lcsc.com/wmsc/upload/file/pdf/v2/lcsc/2304140030_Darfon-Elec-C0603X5R223KDT_C258481.pdf; ComponentLink2Description: JLCPCB Part URL; ComponentLink2URL: https://jlcpcb.com/partdetail/C258481; ComponentLink3Description: LCSC Part URL; ComponentLink3URL: https://lcsc.com/product-detail/Multilayer-Ceramic-Capacitors-MLCC---SMD-SMT_Darfon-Elec-Darfon-Elec-C0603X5R223KDT_C258481.html
footprint CAP-0201 (0201 (0603M) Capacitor)
pins: 1, 2

## C0603X5R224MCTS
designator C?  Capacitance: 220nF  (hidden comment: *)
Capacitor, Ceramic (MLCC), 220nF, ±20%, 6.3V, X5R, ±20%, SMD 0201; Manufacturer: Darfon Elec; Manufacturer Part Number: C0603X5R224MCTS; Package Size: 0201; JLCPCB Basic Part: No; JLCPCB Part Number: C258482; Supplier 1: LCSC; Category: Capacitors - MLCC; Supplier Part Number 1: C258482; Tolerance: ±20%; Voltage Rating: 6.3V; Temperature Coefficient: X5R; RoHS: Yes; ComponentLink1Description: Datasheet; ComponentLink1URL: https://wmsc.lcsc.com/wmsc/upload/file/pdf/v2/lcsc/2304140030_Darfon-Elec-C0603X5R224MCTS_C258482.pdf; ComponentLink2Description: JLCPCB Part URL; ComponentLink2URL: https://jlcpcb.com/partdetail/C258482; ComponentLink3Description: LCSC Part URL; ComponentLink3URL: https://lcsc.com/product-detail/Multilayer-Ceramic-Capacitors-MLCC---SMD-SMT_Darfon-Elec-Darfon-Elec-C0603X5R224MCTS_C258482.html
footprint CAP-0201 (0201 (0603M) Capacitor)
pins: 1, 2

## C0603X7R101KGTS
designator C?  Capacitance: 100pF  (hidden comment: *)
Capacitor, Ceramic (MLCC), 100pF, ±10%, 50V, X7R, ±10%, SMD 0201; Manufacturer: Darfon Elec; Manufacturer Part Number: C0603X7R101KGTS; Package Size: 0201; JLCPCB Basic Part: No; JLCPCB Part Number: C267376; Supplier 1: LCSC; Category: Capacitors - MLCC; Supplier Part Number 1: C267376; Tolerance: ±10%; Voltage Rating: 50V; Temperature Coefficient: X7R; RoHS: Yes; ComponentLink1Description: Datasheet; ComponentLink1URL: https://wmsc.lcsc.com/wmsc/upload/file/pdf/v2/lcsc/2304140030_Darfon-Elec-C0603X7R101KGTS_C267376.pdf; ComponentLink2Description: JLCPCB Part URL; ComponentLink2URL: https://jlcpcb.com/partdetail/C267376; ComponentLink3Description: LCSC Part URL; ComponentLink3URL: https://lcsc.com/product-detail/Multilayer-Ceramic-Capacitors-MLCC---SMD-SMT_Darfon-Elec-Darfon-Elec-C0603X7R101KGTS_C267376.html
footprint CAP-0201 (0201 (0603M) Capacitor)
pins: 1, 2

## C0603X7R102KGTS
designator C?  Capacitance: 1nF  (hidden comment: *)
Capacitor, Ceramic (MLCC), 1nF, ±10%, 50V, X7R, ±10%, SMD 0201; Manufacturer: Darfon Elec; Manufacturer Part Number: C0603X7R102KGTS; Package Size: 0201; JLCPCB Basic Part: No; JLCPCB Part Number: C258477; Supplier 1: LCSC; Category: Capacitors - MLCC; Supplier Part Number 1: C258477; Tolerance: ±10%; Voltage Rating: 50V; Temperature Coefficient: X7R; RoHS: Yes; ComponentLink1Description: Datasheet; ComponentLink1URL: https://wmsc.lcsc.com/wmsc/upload/file/pdf/v2/lcsc/2304140030_Darfon-Elec-C0603X7R102KGTS_C258477.pdf; ComponentLink2Description: JLCPCB Part URL; ComponentLink2URL: https://jlcpcb.com/partdetail/C258477; ComponentLink3Description: LCSC Part URL; ComponentLink3URL: https://lcsc.com/product-detail/Multilayer-Ceramic-Capacitors-MLCC---SMD-SMT_Darfon-Elec-Darfon-Elec-C0603X7R102KGTS_C258477.html
footprint CAP-0201 (0201 (0603M) Capacitor)
pins: 1, 2

## C0603X7R121KFT
designator C?  Capacitance: 120pF  (hidden comment: *)
Capacitor, Ceramic (MLCC), 120pF, ±10%, 25V, X7R, ±10%, SMD 0201; Manufacturer: Darfon Elec; Manufacturer Part Number: C0603X7R121KFT; Package Size: 0201; JLCPCB Basic Part: No; JLCPCB Part Number: C267378; Supplier 1: LCSC; Category: Capacitors - MLCC; Supplier Part Number 1: C267378; Tolerance: ±10%; Voltage Rating: 25V; Temperature Coefficient: X7R; RoHS: Yes; ComponentLink1Description: Datasheet; ComponentLink1URL: https://wmsc.lcsc.com/wmsc/upload/file/pdf/v2/lcsc/2304140030_Darfon-Elec-C0603X7R121KFT_C267378.pdf; ComponentLink2Description: JLCPCB Part URL; ComponentLink2URL: https://jlcpcb.com/partdetail/C267378; ComponentLink3Description: LCSC Part URL; ComponentLink3URL: https://lcsc.com/product-detail/Multilayer-Ceramic-Capacitors-MLCC---SMD-SMT_Darfon-Elec-Darfon-Elec-C0603X7R121KFT_C267378.html
footprint CAP-0201 (0201 (0603M) Capacitor)
pins: 1, 2

## C0603X7R152KFT
designator C?  Capacitance: 1.5nF  (hidden comment: *)
Capacitor, Ceramic (MLCC), 1.5nF, ±10%, 25V, X7R, ±10%, SMD 0201; Manufacturer: Darfon Elec; Manufacturer Part Number: C0603X7R152KFT; Package Size: 0201; JLCPCB Basic Part: No; JLCPCB Part Number: C267379; Supplier 1: LCSC; Category: Capacitors - MLCC; Supplier Part Number 1: C267379; Tolerance: ±10%; Voltage Rating: 25V; Temperature Coefficient: X7R; RoHS: Yes; ComponentLink1Description: Datasheet; ComponentLink1URL: https://wmsc.lcsc.com/wmsc/upload/file/pdf/v2/lcsc/2304140030_Darfon-Elec-C0603X7R152KFT_C267379.pdf; ComponentLink2Description: JLCPCB Part URL; ComponentLink2URL: https://jlcpcb.com/partdetail/C267379; ComponentLink3Description: LCSC Part URL; ComponentLink3URL: https://lcsc.com/product-detail/Multilayer-Ceramic-Capacitors-MLCC---SMD-SMT_Darfon-Elec-Darfon-Elec-C0603X7R152KFT_C267379.html
footprint CAP-0201 (0201 (0603M) Capacitor)
pins: 1, 2

## C0603X7R221KGT
designator C?  Capacitance: 220pF  (hidden comment: *)
Capacitor, Ceramic (MLCC), 220pF, ±10%, 50V, X7R, ±10%, SMD 0201; Manufacturer: Darfon Elec; Manufacturer Part Number: C0603X7R221KGT; Package Size: 0201; JLCPCB Basic Part: No; JLCPCB Part Number: C258475; Supplier 1: LCSC; Category: Capacitors - MLCC; Supplier Part Number 1: C258475; Tolerance: ±10%; Voltage Rating: 50V; Temperature Coefficient: X7R; RoHS: Yes; ComponentLink1Description: Datasheet; ComponentLink1URL: https://wmsc.lcsc.com/wmsc/upload/file/pdf/v2/lcsc/2304140030_Darfon-Elec-C0603X7R221KGT_C258475.pdf; ComponentLink2Description: JLCPCB Part URL; ComponentLink2URL: https://jlcpcb.com/partdetail/C258475; ComponentLink3Description: LCSC Part URL; ComponentLink3URL: https://lcsc.com/product-detail/Multilayer-Ceramic-Capacitors-MLCC---SMD-SMT_Darfon-Elec-Darfon-Elec-C0603X7R221KGT_C258475.html
footprint CAP-0201 (0201 (0603M) Capacitor)
pins: 1, 2
